# Altium footprint library LibraryProject.PcbLib: 20 footprints (part 2 of 2)
Each footprint in its own frame and in the unit in brackets; x right, y up, seen from the top. Pads: shape width x height; smd on the part's side, far side on the other; paste and mask are expansions set on the pad; w line width, h text height; cw(c..) or ccw(c..) is an arc to the next point about the centre after c.
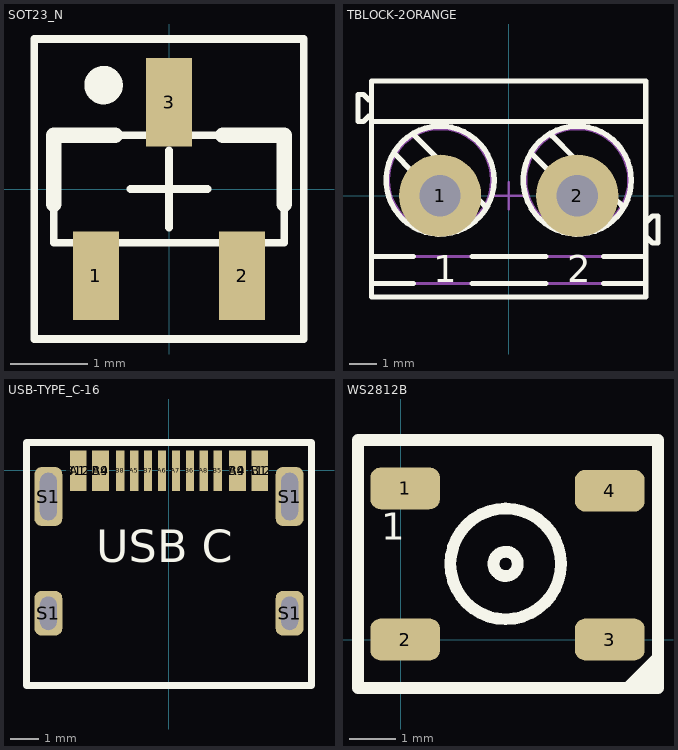
[diagram p1: the footprints below, top view; thin cyan lines are the x and y axes]

## SOT23_N [mm] "SOT23, 3-Leads, Body 2.9x1.3mm, Pitch 0.95mm, Lead Span 2.3mm - Reverse Pinning, IPC Medium Density"
height 1.1
pads (3):
  rect 0.6x1.15 smd: 1(-0.95,-1.125) 2(0.95,-1.125) 3(0,1.125)
Top Overlay:
  circle w0.25: c-0.85,1.35 r0.125
  lines w0.1: -0.5,0 0.5,0 ; 0,-0.5 0,0.5 ; -1.75,-1.95 -1.75,1.95 1.75,1.95 1.75,-1.95 -1.75,-1.95 ; -1.5,-0.7 -1.5,0.7 1.5,0.7 1.5,-0.7 -1.5,-0.7
  lines w0.2: -1.5,-0.2 -1.5,0.7 -0.7,0.7 ; 0.7,0.7 1.5,0.7 1.5,-0.2
3D body "sot23-3_p0-95_l3-04_w1-4.stp": height 0.94, standoff -0.1, extent -1.52,-1.42 1.52,1.22

## TBLOCK-2ORANGE [mil] "Terminal Block, 24A 600V, Pitch 5.08mm, 2 Positions, Screw Connection"
height 393.7
pads (2):
  round 120 hole 60: 1(-100,0) 2(100,0)
Top Overlay:
  circle w7.87: c-100,22.72 r78.74
  circle w7.87: c100,22.72 r78.74
  lines w7.87: -200,-127.95 -138.78,-127.95 ; -200,-88.58 -138.78,-88.58 ; -200,108.27 200,108.27 ; -200,116.14 -203.94,116.14 -211.81,108.27 -219.69,108.27 -219.69,147.64 -211.81,147.64 -203.94,139.76 -200,139.76 ; -164.95,59.83 -141.45,36.33 ; -137.11,87.67 -104.39,54.94 ; -63.67,-41.45 -62.89,-42.23 ; -53.15,-127.95 54.13,-127.95 ; -53.15,-88.58 54.13,-88.58 ; -45.06,-4.39 -35.05,-14.39 ; 35.05,59.83 58.55,36.33 ; 62.89,87.67 95.61,54.94 ; 136.33,-41.45 137.11,-42.23 ; 138.78,-127.95 200,-127.95 ; 138.78,-88.58 200,-88.58 ; 154.94,-4.39 164.95,-14.39 ; 200,-61.02 201.97,-61.02 209.84,-68.9 217.72,-68.9 217.72,-29.53 209.84,-29.53 201.97,-37.4 200,-37.4 ; -200,-147.64 -200,167.32 200,167.32 200,-147.64 -200,-147.64
  text "1" at -109.92,-125.98 h39.37
  text "2" at 85.41,-125.98 h39.37
Mechanical 8:
  lines w3.94: -119.69,0 -100,0 ; -100,-19.69 -100,0 ; -100,19.69 -100,0 ; -80.31,0 -100,0 ; -19.69,0 0,0 ; 0,-19.69 0,0 ; 0,19.69 0,0 ; 19.69,0 0,0 ; 80.31,0 100,0 ; 100,-19.69 100,0 ; 100,19.69 100,0 ; 119.69,0 100,0
Mechanical 14:
  circle w3.94: c-100,22.72 r74.8
  circle w3.94: c-100,22.72 r78.74
  circle w3.94: c100,22.72 r74.8
  circle w3.94: c100,22.72 r78.74
  lines w3.94: -200,-127.95 200,-127.95 ; -200,-88.58 200,-88.58 ; -200,108.27 200,108.27 ; -200,116.14 -203.94,116.14 -211.81,108.27 -219.69,108.27 -219.69,147.64 -211.81,147.64 -203.94,139.76 -200,139.76 ; -164.95,59.83 -62.89,-42.23 ; -137.11,87.67 -35.05,-14.39 ; 35.05,59.83 137.11,-42.23 ; 62.89,87.67 164.95,-14.39 ; 200,-61.02 201.97,-61.02 209.84,-68.9 217.72,-68.9 217.72,-29.53 209.84,-29.53 201.97,-37.4 200,-37.4 ; -200,-147.64 -200,167.32 200,167.32 200,-147.64 -200,-147.64
  text "2" at 85.41,-125.98 h39.37
  text "1" at -109.92,-125.98 h39.37
3D body "WEIDMULLER_1760490000.stp": height 393.7, standoff -137.8, extent -219.68,-147.63 217.72,167.33

## USB-TYPE_C-16 [mm]
pads (20):
  rect 0.6x1.45 smd: A1(-3.246,-0.019) A4(-2.446,-0.019) A9(2.454,-0.019) A12(3.254,-0.019) B1(3.254,-0.019) B4(2.454,-0.019) B9(-2.446,-0.019) B12(-3.246,-0.019)
  rect 0.3x1.45 smd: A5(-1.246,-0.019) A6(-0.246,-0.019) A7(0.254,-0.019) A8(1.254,-0.019) B5(1.754,-0.019) B6(0.754,-0.019) B7(-0.746,-0.019) B8(-1.746,-0.019)
  rrect50% 1x1.6 hole 0.6 slot 1.2 at 90 deg: S1(-4.316,-5.114) S1(4.324,-5.114)
  rrect50% 1x2.1 hole 0.6 slot 1.7 at 90 deg: S1(-4.316,-0.934) S1(4.324,-0.934)
Top Overlay:
  lines w0.254: -5.1,-7.7 -5.1,1 5.1,1 5.1,-7.7 -5,-7.7 -5.1,-7.7
  text "USB C" at -2.6,-3.677 h2
3D body "USB_C16pins.STEP": height 3.25, standoff -0.91, extent -4.782,-7.564 4.798,0.144

## WS2812B [mm]
pads (4):
  rrect50% 1.5x0.9 smd: 1(0.1,3.25) 2(0.1,0) 3(4.5,0) 4(4.5,3.2)
Top Overlay:
  circle w0.254: c2.261,1.626 r0.262
  circle w0.254: c2.261,1.626 r1.189
  lines w0.254: 5.35,-0.75 5.35,-0.854 5.537,-1.041 ; 5.486,-0.559 5.486,-0.437 4.886,-1.038 4.924,-1.038 4.928,-1.041 5.059,-1.041 5.5,-0.6 5.2,-0.9 ; 5.2,-0.9 5.2,-0.9 ; 5.537,-1.041 5.537,4.289 3.385,4.289 0.519,4.289 -0.914,4.289 -0.914,-1.041 5.537,-1.041
  text "1" at -0.414,1.948 h1
3D body "WS2812_RGB_LED_updated.stp": height 1.7, standoff 0, extent -0.391,-0.875 4.959,4.075